# Altium footprint library common.PcbLib: 552 footprints (part 4 of 35)
Each footprint in its own frame and in the unit in brackets; x right, y up, seen from the top. Pads: shape width x height; smd on the part's side, far side on the other; paste and mask are expansions set on the pad; w line width, h text height; cw(c..) or ccw(c..) is an arc to the next point about the centre after c.
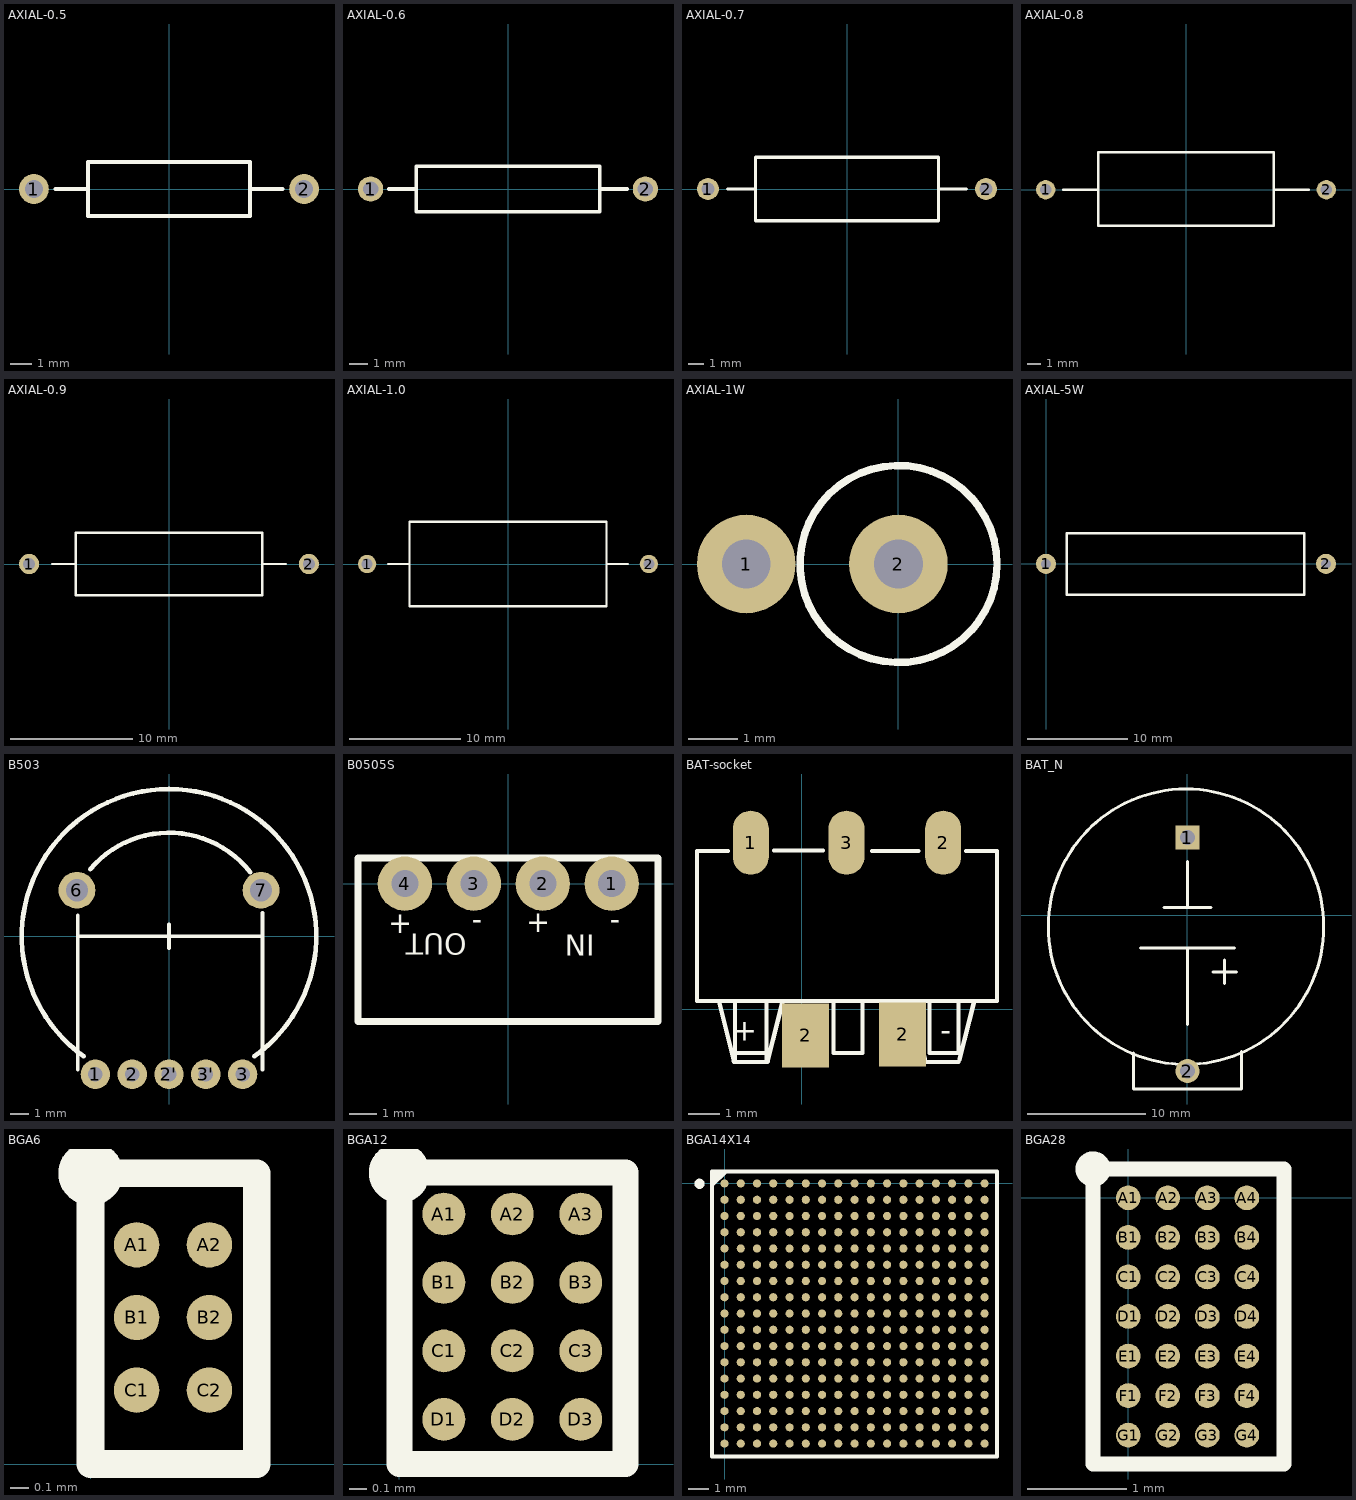
[diagram p3: the footprints below, top view; thin cyan lines are the x and y axes]

## AXIAL-0.5 [mm] "1/2W/1W"
height 2.54
pads (2):
  round 1.4 hole 0.85: 1(-6.35,0) 2(6.35,0)
Top Overlay:
  lines w0.2: -5.334,0 -3.81,0 ; 3.81,0 5.334,0 ; -3.81,-1.27 3.81,-1.27 3.81,1.27 -3.81,1.27 -3.81,-1.27
3D body: height 3.1, standoff -1.5, extent -6.731,-1.461 6.731,1.397

## AXIAL-0.6 [mm] "Variable Resistor; 2 Leads"
height 2.54
pads (2):
  round 1.4 hole 0.85: 1(-7.62,0) 2(7.62,0)
Top Overlay:
  lines w0.2: -6.604,0 -5.08,0 ; 5.08,0 6.604,0 ; -5.08,-1.27 5.08,-1.27 5.08,1.27 -5.08,1.27 -5.08,-1.27
3D body: height 2.5, standoff -0.8, extent -7.737,-1.351 7.823,1.249

## AXIAL-0.7 [mm] "Variable Resistor; 2 Leads"
height 4.064
pads (2):
  round 1.4 hole 0.85: 1(-8.89,0) 2(8.89,0)
Top Overlay:
  lines w0.2: -7.62,0 -5.842,0 ; 5.842,0 7.62,0 ; -5.842,-2.032 -5.842,2.032 5.842,2.032 5.842,-2.032 -5.842,-2.032
3D body: height 4.3, standoff -1, extent -9.214,-2.413 9.246,2.187

## AXIAL-0.8 [mm] "2W"
height 4.064
pads (2):
  round 1.4 hole 0.85: 1(-10.16,0) 2(10.16,0)
Top Overlay:
  lines w0.2: -8.89,0 -6.35,0 ; 6.35,0 8.89,0 ; -6.35,-2.616 -6.35,2.718 6.35,2.718 6.35,-2.616 -6.35,-2.616
3D body: height 5.5, standoff -3, extent -10.485,-2.655 10.535,2.845

## AXIAL-0.9 [mm] "Magnetic-Core Inductor; 2 Leads"
height 5.08
pads (2):
  round 1.65 hole 1: 1(-11.43,0) 2(11.43,0)
Top Overlay:
  lines w0.2: -9.525,0 -7.62,0 ; 7.62,0 9.525,0 ; -7.62,-2.54 7.62,-2.54 7.62,2.54 -7.62,2.54 -7.62,-2.54
3D body: height 4.3, standoff -1, extent -11.889,-2.362 11.811,2.238

## AXIAL-1.0 [mm] "Adjustable Magnetic-Core Inductor; 2 Leads"
height 7.62
pads (2):
  round 1.65 hole 1: 1(-12.7,0) 2(12.7,0)
Top Overlay:
  lines w0.2: -10.795,0 -8.89,0 ; 8.89,0 10.795,0 ; -8.89,-3.81 -8.89,3.81 8.89,3.81 8.89,-3.81 -8.89,-3.81
3D body: height 4.3, standoff -1, extent -13.068,-2.362 13.132,2.238

## AXIAL-1W [mil]
pads (2):
  round 79 hole 39: 1(-122.05,0) 2(0,0)
Top Overlay:
  circle w6: c0,0 r79
3D body: height 572.61, standoff -75.5, extent -137.24,-83.36 83.23,82

## AXIAL-5W [mm]
pads (2):
  round 2 hole 1: 1(0,0) 2(27.915,0)
Top Overlay:
  lines w0.254: 2.07,-3.073 2.07,3.048 25.743,3.048 25.743,-3.073 2.07,-3.073
3D body: height 8.01, standoff -9, extent -0.4,-3 28.34,3

## B503 [mm]
pads (7):
  round 1.6 hole 0.8: 1(-4,-7.5) 2(-2,-7.5) 2'(0,-7.5) 3(4,-7.5) 3'(2,-7.5)
  round 2 hole 1.2: 6(-5,2.5) 7(5,2.5)
Top Overlay:
  lines w0.2: -4.953,-7.239 -4.953,0 ; -4.953,1.143 -4.953,0 ; 0,-0.635 0,0.635 ; 5.08,-7.239 5.08,0 ; 5.08,1.27 5.08,0 ; -4.953,0 5.08,0
  lines w0.254: -4.624,-6.528 cw(c0,0) 4.624,-6.528 ; -4.281,3.647 cw(c0,0) 4.418,3.481
3D body: height 10.75, standoff -2.5, extent -9.974,-10.152 10.026,9.848

## B0505S [mm]
pads (4):
  round 2 hole 1: 1(3.81,0) 2(1.27,0) 3(-1.27,0) 4(-3.81,0)
Top Overlay:
  lines w0.254: -5.537,-5.08 -5.537,0.94 5.512,0.94 5.512,-5.08 -5.537,-5.08
  text "+" at -3.531,-1.143 h0.76
  text "-" at -0.965,-1.118 h0.76
  text "-" at 4.115,-1.118 h0.76
  text "+" at 1.549,-1.118 h0.76
  text "IN" at 3.175,-1.88 h0.76
  text "OUT" at -1.524,-1.854 h0.76
3D body: height 10, standoff 0, extent -5.537,-5.055 5.537,0.914

## BAT-socket [mm]
pads (5):
  oval 1.143x2.032 smd: 1(-1.62,5.283) 2(4.49,5.283) 3(1.42,5.283)
  rect 1.5x2.032 smd: 2(0.12,-0.83) 2(3.2,-0.8)
Top Overlay:
  drawing of 432 lines, arcs and shapes, not listed
  text "+" at -1.41,-1.01 h0.7
  text "-" at 4.75,-1.01 h0.7
3D body: height 6.9, standoff 0.15, extent -3.302,-2.072 6.198,5.73

## BAT_N [mil] "CR2032电池座（未加焊）"
pads (2):
  rect 80x80 hole 50: 1(0.21,260.42)
  round 80 hole 50: 2(0.21,-519.58)
Top Overlay:
  circle w10: c-4.79,-37.58 r460
  lines w10: -179.79,-459.58 -179.79,-579.58 180.21,-579.58 180.21,-453.58 ; -156.79,-108.58 157.21,-108.58 ; -77.79,27.34 78.21,27.34 ; 0.21,-364.58 0.21,-108.58 ; 0.21,28.73 0.21,180.42 ; 85.43,-188.34 164.43,-188.34 ; 124.43,-227.34 124.43,-148.34
3D body: height 301.57, standoff -181.11, extent -435.69,-565.55 435.69,385.94

## BGA6 [mm]
pads (6):
  round 0.25 smd: A1(0.254,1.206) A2(0.654,1.206) B1(0.254,0.806) B2(0.654,0.806) C1(0.254,0.406) C2(0.654,0.406)
Top Overlay:
  circle w0.254: c0,1.6 r0.051
  lines w0.152: 0,0 0,1.6 0.914,1.6 0.914,0 0,0
3D body: height 0.38, standoff 0, extent 0,0 0.914,1.6

## BGA12 [mm]
pads (12):
  round 0.25 smd: A1(0.26,1.46) A2(0.66,1.46) A3(1.06,1.46) B1(0.26,1.06) B2(0.66,1.06) B3(1.06,1.06) C1(0.26,0.66) C2(0.66,0.66) C3(1.06,0.66) D1(0.26,0.26) D2(0.66,0.26) D3(1.06,0.26)
Top Overlay:
  circle w0.254: c0,1.702 r0.051
  lines w0.152: 0,0 0,1.702 1.321,1.702 1.321,0 0,0
3D body: height 0.51, standoff 0, extent 0,0 1.321,1.702

## BGA14X14 [mm]
pads (289):
  round 0.4 smd: A1(0,0) A2(0.8,0) A3(1.6,0) A4(2.4,0) A5(3.2,0) A6(4,0) A7(4.8,0) A8(5.6,0) A9(6.4,0) A10(7.2,0) A11(8,0) A12(8.8,0) A13(9.6,0) A14(10.4,0) A15(11.2,0) A16(12,0) A17(12.8,0) B1(0,-0.8) B2(0.8,-0.8) B3(1.6,-0.8) B4(2.4,-0.8) B5(3.2,-0.8) B6(4,-0.8) B7(4.8,-0.8) B8(5.6,-0.8) B9(6.4,-0.8) B10(7.2,-0.8) B11(8,-0.8) B12(8.8,-0.8) B13(9.6,-0.8) B14(10.4,-0.8) B15(11.2,-0.8) B16(12,-0.8) B17(12.8,-0.8) C1(0,-1.6) C2(0.8,-1.6) C3(1.6,-1.6) C4(2.4,-1.6) C5(3.2,-1.6) C6(4,-1.6) C7(4.8,-1.6) C8(5.6,-1.6) C9(6.4,-1.6) C10(7.2,-1.6) C11(8,-1.6) C12(8.8,-1.6) C13(9.6,-1.6) C14(10.4,-1.6) C15(11.2,-1.6) C16(12,-1.6) C17(12.8,-1.6) D1(0,-2.4) D2(0.8,-2.4) D3(1.6,-2.4) D4(2.4,-2.4) D5(3.2,-2.4) D6(4,-2.4) D7(4.8,-2.4) D8(5.6,-2.4) D9(6.4,-2.4) D10(7.2,-2.4) D11(8,-2.4) D12(8.8,-2.4) D13(9.6,-2.4) D14(10.4,-2.4) D15(11.2,-2.4) D16(12,-2.4) D17(12.8,-2.4) E1(0,-3.2) E2(0.8,-3.2) E3(1.6,-3.2) E4(2.4,-3.2) E5(3.2,-3.2) E6(4,-3.2) E7(4.8,-3.2) E8(5.6,-3.2) E9(6.4,-3.2) E10(7.2,-3.2) E11(8,-3.2) E12(8.8,-3.2) E13(9.6,-3.2) E14(10.4,-3.2) E15(11.2,-3.2) E16(12,-3.2) E17(12.8,-3.2) F1(0,-4) F2(0.8,-4) F3(1.6,-4) F4(2.4,-4) F5(3.2,-4) F6(4,-4) F7(4.8,-4) F8(5.6,-4) F9(6.4,-4) F10(7.2,-4) F11(8,-4) F12(8.8,-4) F13(9.6,-4) F14(10.4,-4) F15(11.2,-4) F16(12,-4) F17(12.8,-4) G1(0,-4.8) G2(0.8,-4.8) G3(1.6,-4.8) G4(2.4,-4.8) G5(3.2,-4.8) G6(4,-4.8) G7(4.8,-4.8) G8(5.6,-4.8) G9(6.4,-4.8) G10(7.2,-4.8) G11(8,-4.8) G12(8.8,-4.8) G13(9.6,-4.8) G14(10.4,-4.8) G15(11.2,-4.8) G16(12,-4.8) G17(12.8,-4.8) H1(0,-5.6) H2(0.8,-5.6) H3(1.6,-5.6) H4(2.4,-5.6) H5(3.2,-5.6) H6(4,-5.6) H7(4.8,-5.6) H8(5.6,-5.6) H9(6.4,-5.6) H10(7.2,-5.6) H11(8,-5.6) H12(8.8,-5.6) H13(9.6,-5.6) H14(10.4,-5.6) H15(11.2,-5.6) H16(12,-5.6) H17(12.8,-5.6) J1(0,-6.4) J2(0.8,-6.4) J3(1.6,-6.4) J4(2.4,-6.4) J5(3.2,-6.4) J6(4,-6.4) J7(4.8,-6.4) J8(5.6,-6.4) J9(6.4,-6.4) J10(7.2,-6.4) J11(8,-6.4) J12(8.8,-6.4) J13(9.6,-6.4) J14(10.4,-6.4) J15(11.2,-6.4) J16(12,-6.4) J17(12.8,-6.4) K1(0,-7.2) K2(0.8,-7.2) K3(1.6,-7.2) K4(2.4,-7.2) K5(3.2,-7.2) K6(4,-7.2) K7(4.8,-7.2) K8(5.6,-7.2) K9(6.4,-7.2) K10(7.2,-7.2) K11(8,-7.2) K12(8.8,-7.2) K13(9.6,-7.2) K14(10.4,-7.2) K15(11.2,-7.2) K16(12,-7.2) K17(12.8,-7.2) L1(0,-8) L2(0.8,-8) L3(1.6,-8) L4(2.4,-8) L5(3.2,-8) L6(4,-8) L7(4.8,-8) L8(5.6,-8) L9(6.4,-8) L10(7.2,-8) L11(8,-8) L12(8.8,-8) L13(9.6,-8) L14(10.4,-8) L15(11.2,-8) L16(12,-8) L17(12.8,-8) M1(0,-8.8) M2(0.8,-8.8) M3(1.6,-8.8) M4(2.4,-8.8) M5(3.2,-8.8) M6(4,-8.8) M7(4.8,-8.8) M8(5.6,-8.8) M9(6.4,-8.8) M10(7.2,-8.8) M11(8,-8.8) M12(8.8,-8.8) M13(9.6,-8.8) M14(10.4,-8.8) M15(11.2,-8.8) M16(12,-8.8) M17(12.8,-8.8) N1(0,-9.6) N2(0.8,-9.6) N3(1.6,-9.6) N4(2.4,-9.6) N5(3.2,-9.6) N6(4,-9.6) N7(4.8,-9.6) N8(5.6,-9.6) N9(6.4,-9.6) N10(7.2,-9.6) N11(8,-9.6) N12(8.8,-9.6) N13(9.6,-9.6) N14(10.4,-9.6) N15(11.2,-9.6) N16(12,-9.6) N17(12.8,-9.6) P1(0,-10.4) P2(0.8,-10.4) P3(1.6,-10.4) P4(2.4,-10.4) P5(3.2,-10.4) P6(4,-10.4) P7(4.8,-10.4) P8(5.6,-10.4) P9(6.4,-10.4) P10(7.2,-10.4) P11(8,-10.4) P12(8.8,-10.4) P13(9.6,-10.4) P14(10.4,-10.4) P15(11.2,-10.4) P16(12,-10.4) P17(12.8,-10.4) R1(0,-11.2) R2(0.8,-11.2) R3(1.6,-11.2) R4(2.4,-11.2) R5(3.2,-11.2) R6(4,-11.2) R7(4.8,-11.2) R8(5.6,-11.2) R9(6.4,-11.2) R10(7.2,-11.2) R11(8,-11.2) R12(8.8,-11.2) R13(9.6,-11.2) R14(10.4,-11.2) R15(11.2,-11.2) R16(12,-11.2) R17(12.8,-11.2) T1(0,-12) T2(0.8,-12) T3(1.6,-12) T4(2.4,-12) T5(3.2,-12) T6(4,-12) T7(4.8,-12) T8(5.6,-12) T9(6.4,-12) T10(7.2,-12) T11(8,-12) T12(8.8,-12) T13(9.6,-12) T14(10.4,-12) T15(11.2,-12) T16(12,-12) T17(12.8,-12) U1(0,-12.8) U2(0.8,-12.8) U3(1.6,-12.8) U4(2.4,-12.8) U5(3.2,-12.8) U6(4,-12.8) U7(4.8,-12.8) U8(5.6,-12.8) U9(6.4,-12.8) U10(7.2,-12.8) U11(8,-12.8) U12(8.8,-12.8) U13(9.6,-12.8) U14(10.4,-12.8) U15(11.2,-12.8) U16(12,-12.8) U17(12.8,-12.8)
Top Overlay:
  circle w0.25: c-1.229,-0.016 r0.125
  region: 0.109,0.585 -0.61,-0.134 -0.61,0.585
  lines w0.2: -0.61,-0.085 0.063,0.589 ; -0.61,-13.436 -0.61,0.585 13.41,0.585 13.41,-13.436 -0.61,-13.436
3D body: height 2.43, standoff 0, extent -0.578,-13.478 13.41,0.543

## BGA28 [mm]
pads (28):
  round 0.25 smd: A1(0,0) A2(0.4,0) A3(0.8,0) A4(1.2,0) B1(0,-0.4) B2(0.4,-0.4) B3(0.8,-0.4) B4(1.2,-0.4) C1(0,-0.8) C2(0.4,-0.8) C3(0.8,-0.8) C4(1.2,-0.8) D1(0,-1.2) D2(0.4,-1.2) D3(0.8,-1.2) D4(1.2,-1.2) E1(0,-1.6) E2(0.4,-1.6) E3(0.8,-1.6) E4(1.2,-1.6) F1(0,-2) F2(0.4,-2) F3(0.8,-2) F4(1.2,-2) G2(0.4,-2.4) G4(1.2,-2.4)
  round 0.25 smd mask+0.102: G1(0,-2.4) G3(0.8,-2.4)
Top Overlay:
  circle w0.254: c-0.356,0.292 r0.051
  lines w0.152: -0.356,-2.692 -0.356,0.292 1.575,0.292 1.575,-2.692 -0.356,-2.692
3D body: height 0.51, standoff 0, extent -0.356,-2.692 1.575,0.292